# Altium integrated library vh_altium_library.intLib: 963 symbols (part 5 of 5) (continued)
## BYPASS-MINI-CLOSED (continued)
SOLDERDOT BYPASS; Manufacturer Part Number 1: Board Feature; Reel: Closed; Description: Solderdot; Supplier 1: Solder-it-yourself; Manufacturer 1: Board feature
footprint BYPASS-MINI-CLOSED (SOLDERDOT BYPASS)
pins: 1, 2

## DF9-25
designator K?
HIROSE DF9 25 PIN
pins: 1, 2, 3, 4, 5, 6, 7, 8, 9, 10, 11, 12, 13, 14, 15, 16, 17, 18, 19, 20, 21, 22, 23, 24, 25

## DF9-31-F
designator K?
HIROSE DF9 31 PIN
footprint DF9-31-F
pins: 1, 2, 3, 4, 5, 6, 7, 8, 9, 10, 11, 12, 13, 14, 15, 16, 17, 18, 19, 20, 21, 22, 23, 24, 25, 26, 27, 28, 29, 30, 31

## MMC
designator K?
MMC CONNECTOR
pins: 1 CS, 2 DI, 3 VSS, 4 VDD, 5 SCLK, 6 VSS, 7 DO, 8 IRQ, 9 RSV, 10 CD, 11 COM, 12 SHIELD, 13 WP
text: SD / MMC

## MOLEX-501951-3010
designator K?
footprint molex-501951-3010 (MOLEX FPC CONNECTOR 30 POSITIONS)
pins: 1, 2, 3, 4, 5, 6, 7, 8, 9, 10, 11, 12, 13, 14, 15, 16, 17, 18, 19, 20, 21, 22, 23, 24, 25, 26, 27, 28, 29, 30


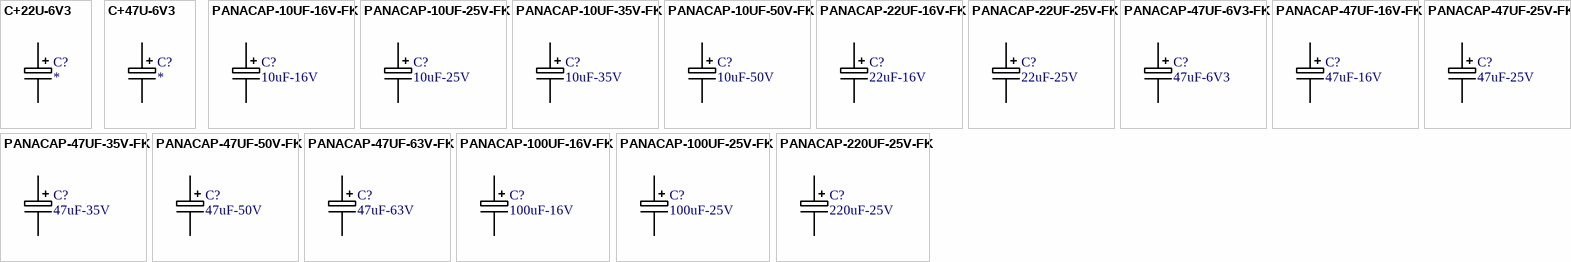
[diagram p57: symbols C+22U-6V3 to PANACAP-220UF-25V-FK]

## C+22U-6V3
designator C?
GENERIC CAPACITOR POLARISED; Supplier 1: Digi-Key; Supplier Part Number 1: PCE4373TR-ND
footprint PANACAP-B (Footprint not found)
pins: +, -

## C+47U-6V3
designator C?
GENERIC CAPACITOR POLARISED; Supplier 1: Digi-Key; Supplier Part Number 1: PCE4375TR-ND
footprint PANACAP-C
pins: +, -

## PANACAP-10UF-16V-FK
designator C?, comment 10uF-16V
GENERIC CAPACITOR POLARISED; Supplier 1: Digi-Key; Supplier Part Number 1: PCE3782TR-ND
footprint PANACAP-b
pins: +, -

## PANACAP-10UF-25V-FK
designator C?, comment 10uF-25V
GENERIC CAPACITOR POLARISED; Supplier 1: Digi-Key; Supplier Part Number 1: PCE4407TR-ND
footprint PANACAP-B
pins: +, -

## PANACAP-10UF-35V-FK
designator C?, comment 10uF-35V
GENERIC CAPACITOR POLARISED; Supplier 1: Digi-Key; Supplier Part Number 1: PCE3834TR-ND
footprint PANACAP-C
pins: +, -

## PANACAP-10UF-50V-FK
designator C?, comment 10uF-50V
GENERIC CAPACITOR POLARISED; Supplier 1: Digi-Key; Supplier Part Number 1: PCE3807TR-ND
footprint PANACAP-D-GENERIC
pins: +, -

## PANACAP-22UF-16V-FK
designator C?, comment 22uF-16V
GENERIC CAPACITOR POLARISED; Supplier 1: Digi-Key; Supplier Part Number 1: PCE3785TR-ND
footprint PANACAP-C
pins: +, -

## PANACAP-22UF-25V-FK
designator C?, comment 22uF-25V
GENERIC CAPACITOR POLARISED; Supplier 1: Digi-Key; Supplier Part Number 1: PCE3785DKR-ND
footprint PANACAP-C
pins: +, -

## PANACAP-47UF-6V3-FK
designator C?, comment 47uF-6V3
GENERIC CAPACITOR POLARISED; Supplier 1: Digi-Key; Supplier Part Number 1: PCE4374TR-ND
footprint PANACAP-C
pins: +, -

## PANACAP-47UF-16V-FK
designator C?, comment 47uF-16V
GENERIC CAPACITOR POLARISED; Supplier 1: Digi-Key; Supplier Part Number 1: PCE3398TR-ND
footprint PANACAP-D-GENERIC
pins: +, -

## PANACAP-47UF-25V-FK
designator C?, comment 47uF-25V
GENERIC CAPACITOR POLARISED; Supplier 1: Digi-Key; Supplier Part Number 1: PCE3804TR-ND
footprint PANACAP-D-GENERIC
pins: +, -

## PANACAP-47UF-35V-FK
designator C?, comment 47uF-35V
GENERIC CAPACITOR POLARISED; Supplier 1: Digi-Key; Supplier Part Number 1: PCE3842TR-ND
footprint PANACAP-D-GENERIC
pins: +, -

## PANACAP-47UF-50V-FK
designator C?, comment 47uF-50V
GENERIC CAPACITOR POLARISED; Supplier 1: Digi-Key; Supplier Part Number 1: PCE3816TR-ND
footprint PANACAP-E-GENERIC
pins: +, -

## PANACAP-47UF-63V-FK
designator C?, comment 47uF-63V
GENERIC CAPACITOR POLARISED; Supplier 1: Digi-Key; Supplier Part Number 1: PCE3823TR-ND
footprint PANACAP-F-GENERIC
pins: +, -

## PANACAP-100UF-16V-FK
designator C?, comment 100uF-16V
GENERIC CAPACITOR POLARISED; Supplier 1: Digi-Key; Supplier Part Number 1: PCE3783TR-ND
footprint PANACAP-D-GENERIC
pins: +, -

## PANACAP-100UF-25V-FK
designator C?, comment 100uF-25V
GENERIC CAPACITOR POLARISED; Supplier 1: Digi-Key; Supplier Part Number 1: PCE3408TR-ND
footprint PANACAP-e-GENERIC
pins: +, -

## PANACAP-220UF-25V-FK
designator C?, comment 220uF-25V
GENERIC CAPACITOR POLARISED; Supplier 1: Digi-Key; Supplier Part Number 1: PCE3400TR-ND
footprint PANACAP-F-GENERIC
pins: +, -


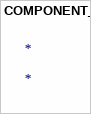
[diagram p58: symbol COMPONENT_1]

## COMPONENT_1
designator *


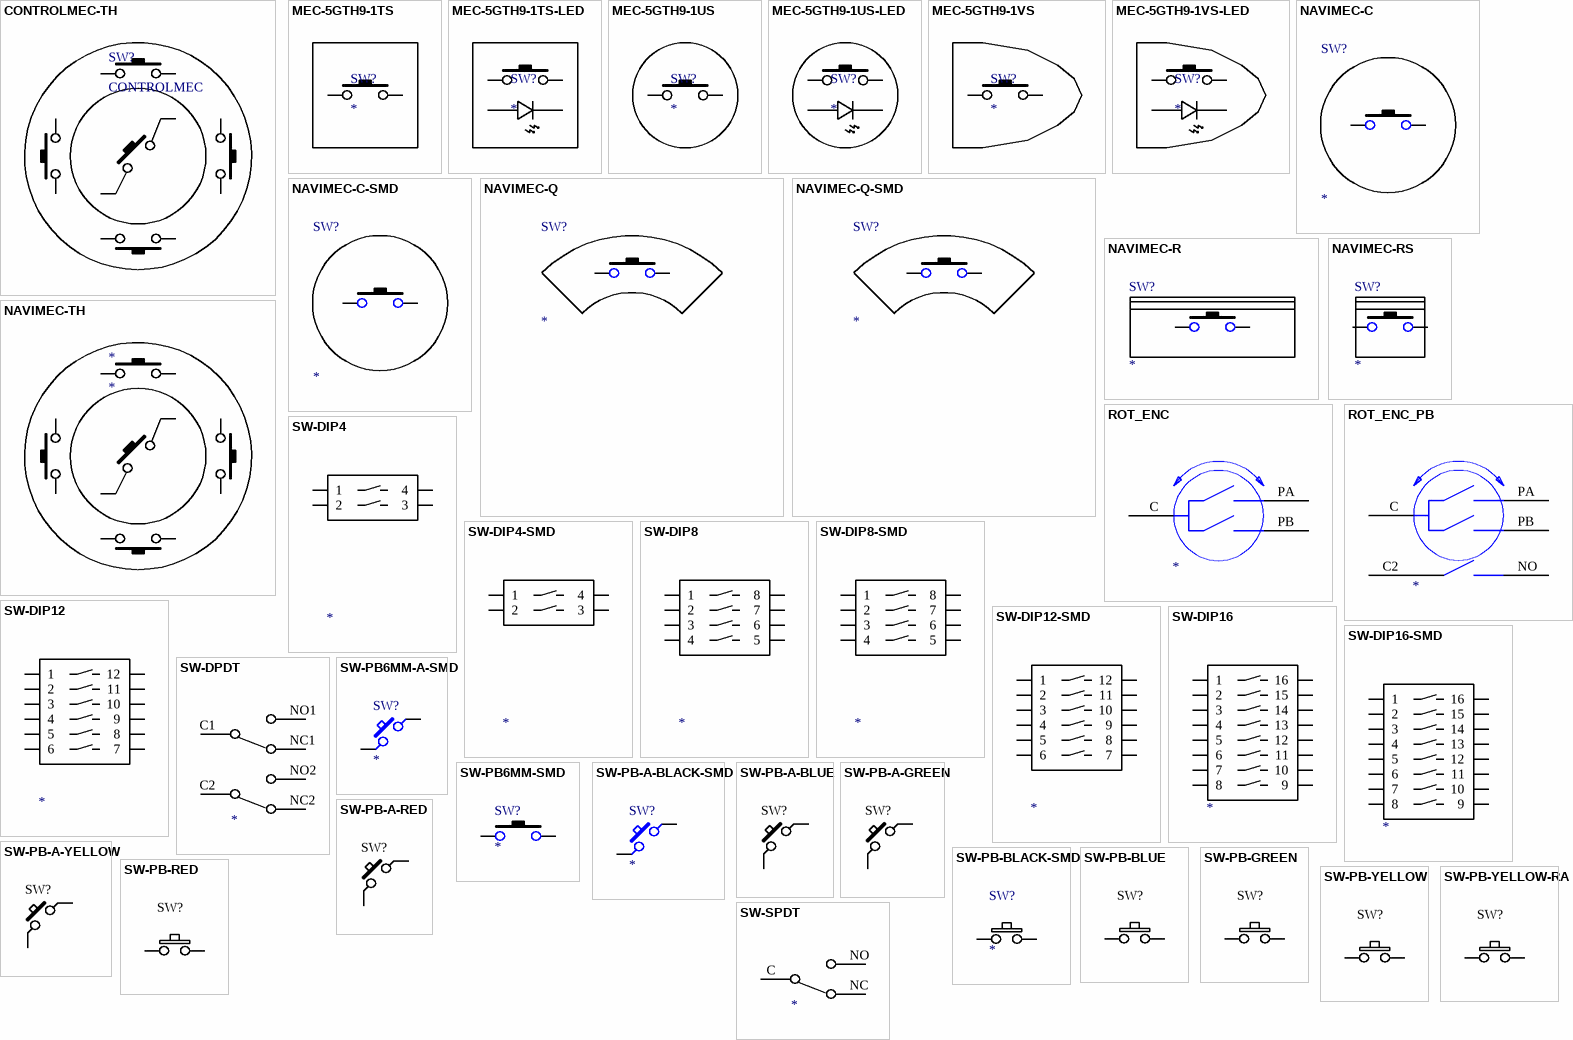
[diagram p59: symbols CONTROLMEC-TH to SW-SPDT]

## CONTROLMEC-TH
designator SW?, comment CONTROLMEC
footprint CONTROLMEC-FULL-TH
pins: B1, B2, L1, L2, M1, M2, R1, R2, T1, T2

## MEC-5GTH9-1TS
designator SW?
footprint MEC-5GTH9-1TS (MEC MULTIMEC 5G THROUGH HOLE + SQUARE CAP)
pins: 1, 2

## MEC-5GTH9-1TS-LED
designator SW?
footprint MEC-5GTH9-1TS (MEC MULTIMEC 5G THROUGH HOLE + SQUARE CAP)
pins: 1, 2, A, K

## MEC-5GTH9-1US
designator SW?
footprint MEC-5GTH9-1US (MEC MULTIMEC 5G THROUGH HOLE + ROUND CAP)
pins: 1, 2

## MEC-5GTH9-1US-LED
designator SW?
footprint MEC-5GTH9-1US (MEC MULTIMEC 5G THROUGH HOLE + ROUND CAP)
pins: 1, 2, A, K

## MEC-5GTH9-1VS
designator SW?
footprint MEC-5GTH9-1VS (MEC MULTIMEC 5G THROUGH HOLE + ARROW CAP)
pins: 1, 2

## MEC-5GTH9-1VS-LED
designator SW?
footprint MEC-5GTH9-1VS (MEC MULTIMEC 5G THROUGH HOLE + ARROW CAP)
pins: 1, 2, A, K

## NAVIMEC-C
designator SW?
NAVIMEC TH CENTER
footprint NAVIMEC-CENTER-TH
pins: 1, 2

## NAVIMEC-C-SMD
designator SW?
NAVIMEC SMD CENTER
footprint NAVIMEC-CENTER
pins: 1, 2

## NAVIMEC-Q
designator SW?
NAVIMEC TH QUADRANT
footprint NAVIMEC-QUADRANT-TH
pins: 1, 2

## NAVIMEC-Q-SMD
designator SW?
NAVIMEC SMD QUADRANT
footprint NAVIMEC-QUADRANT
pins: 1, 2

## NAVIMEC-R
designator SW?
NAVIMEC LONG RECTANGLE
footprint NAVIMEC-250
pins: 1, 2

## NAVIMEC-RS
designator SW?
NAVIMEC SMD SHORT RECTANGLE
pins: 1, 2

## NAVIMEC-TH
designator *
footprint NAVIMEC-FULL-TH
pins: B1, B2, L1, L2, M1, M2, R1, R2, T1, T2

## ROT_ENC
designator ?
ROTARY ENCODER
pins: C, PA, PB

## ROT_ENC_PB
designator ?
ROTARY ENCODER WITH PUSHBUTTON
pins: C, C2, NO, PA, PB

## SW-DIP4
designator ?
2 POLE DIP SWITCH
footprint SW-DIP4
pins: 1, 2, 3, 4

## SW-DIP4-SMD
designator ?
2 POLE DIP SWITCH SMD
footprint SO4SW
pins: 1, 2, 3, 4

## SW-DIP8
designator ?
4 POLE DIP SWITCH
footprint SW-DIP8
pins: 1, 2, 3, 4, 5, 6, 7, 8

## SW-DIP8-SMD
designator ?
4 POLE DIP SWITCH SMD
footprint SO8SW
pins: 1, 2, 3, 4, 5, 6, 7, 8

## SW-DIP12
designator ?
6 POLE DIP SWITCH
footprint SW-DIP12
pins: 1, 2, 3, 4, 5, 6, 7, 8, 9, 10, 11, 12

## SW-DIP12-SMD
designator ?
6 POLE DIP SWITCH SMD
footprint SO12SW
pins: 1, 2, 3, 4, 5, 6, 7, 8, 9, 10, 11, 12

## SW-DIP16
designator ?
8 POLE DIP SWITCH
footprint SW-DIP16
pins: 1, 2, 3, 4, 5, 6, 7, 8, 9, 10, 11, 12, 13, 14, 15, 16

## SW-DIP16-SMD
designator ?
8 POLE DIP SWITCH SMD
footprint SO16SW
pins: 1, 2, 3, 4, 5, 6, 7, 8, 9, 10, 11, 12, 13, 14, 15, 16

## SW-DPDT
designator ?
SWITCH DPDT PCB ANGLED
footprint MS-100968
pins: C1, C2, NC1, NC2, NO1, NO2

## SW-PB6MM-A-SMD
designator SW?
PUSHBUTTON SWITCH 6MM SMD
footprint SW-PB-SMD
pins: 1, 2

## SW-PB6MM-SMD
designator SW?
PUSHBUTTON SWITCH 6MM SMD
footprint SW-PB-SMD
pins: 1, 2

## SW-PB-A-BLACK-SMD
designator SW?
PUSHBUTTON SWITCH 6MM SMD
footprint SW-PB-SMD
pins: 1, 2

## SW-PB-A-BLUE
designator SW?
SW-D6-R / SW-DS-S / SW-14X14 / SW-7X7
footprint SW-PB-BLUE-ROUND4
pins: 1, 2

## SW-PB-A-GREEN
designator SW?
SW-D6-R / SW-DS-S / SW-14X14 / SW-7X7
footprint SW-PB-GREEN-ROUND4
pins: 1, 2

## SW-PB-A-RED
designator SW?
SW-D6-R / SW-DS-S / SW-14X14 / SW-7X7
footprint SW-PB-RED-ROUND4
pins: 1, 2

## SW-PB-A-YELLOW
designator SW?
SW-D6-R / SW-DS-S / SW-14X14 / SW-7X7
footprint SW-PB-YELLOW-ROUND4
pins: 1, 2

## SW-PB-BLACK-SMD
designator SW?
PUSHBUTTON SWITCH 6MM SMD
footprint SW-PB-SMD
pins: 1, 2

## SW-PB-BLUE
designator SW?
SW-D6-R / SW-DS-S / SW-14X14 / SW-7X7
footprint SW-PB-BLUE-ROUND4
pins: 1, 2

## SW-PB-GREEN
designator SW?
SW-D6-R / SW-DS-S / SW-14X14 / SW-7X7
footprint SW-PB-GREEN-ROUND4
pins: 1, 2

## SW-PB-RED
designator SW?
SW-D6-R / SW-DS-S / SW-14X14 / SW-7X7
footprint SW-PB-RED-ROUND4
pins: 1, 2

## SW-PB-YELLOW
designator SW?
SW-D6-R / SW-DS-S / SW-14X14 / SW-7X7
footprint SW-PB-YELLOW-ROUND4
pins: 1, 2

## SW-PB-YELLOW-RA
designator SW?
SW-D6-R / SW-DS-S / SW-14X14 / SW-7X7
footprint SW-OMRONRA-Y
pins: 1, 2

## SW-SPDT
designator ?
pins: C, NC, NO


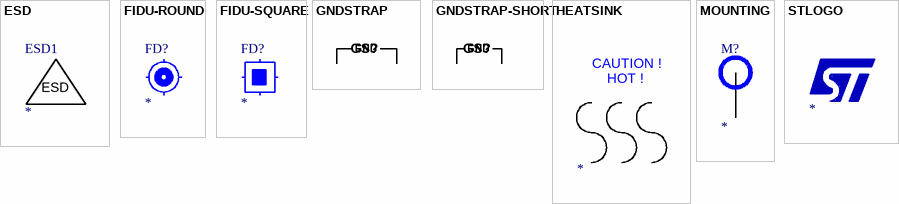
[diagram p60: symbols ESD to STLOGO]

## ESD
designator ESD1
ESD LOGO
footprint ESDSILK

## FIDU-ROUND
designator FD?
ROUND FIDUCIAL
footprint FIDU-ROUND

## FIDU-SQUARE
designator FD?
SQUARE FIDUCIAL
footprint FIDU-SQUARE

## GNDSTRAP
designator GS?, comment GND  (value not drawn)
GROUND CONNECTION BRIDGE; Manufacturer 1: Sharon Long Precision Industries; Manufacturer Part Number 1: Bend-It-Yourself; Reel: TH; Supplier 1: Sharon Long Industries; Supplier Part Number 1: Sharon Long Industries
footprint GNDSTRAP
pins: 1 GND, 2 GND

## GNDSTRAP-SHORT
designator GS?, comment GND  (value not drawn)
GROUND CONNECTION BRIDGE; Manufacturer: Sharon Long Precision Industries; Manufacturer Part Number: Bend-It-Yourself
footprint GNDSTRAP-S
pins: 1 GND, 2 GND

## HEATSINK
designator ?
text: CAUTION !; HOT !

## MOUNTING
designator M?
MOUNTING HOLE - NON INSTALLABLE
footprint MOUNTING
pins: 1, 2, 3, 4, 5, 6, 7

## STLOGO
designator ?
footprint STLOGO-SILVER
footprint STLOGO-MINI-SILVER


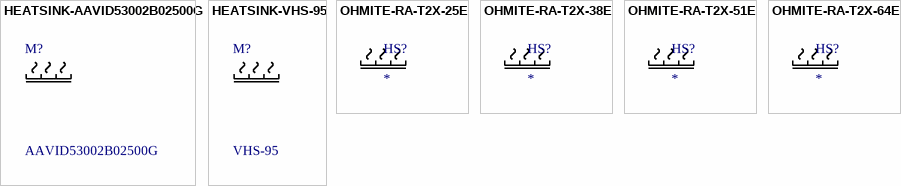
[diagram p61: symbols HEATSINK-AAVID53002B02500G to OHMITE-RA-T2X-64E]

## HEATSINK-AAVID53002B02500G
designator M?, comment AAVID53002B02500G
HEATSINK-AAVID53002B02500G
footprint AAVID53002B02500G

## HEATSINK-VHS-95
designator M?, comment VHS-95
footprint VHS-95 (HALF BRICK CONVERTER HEATSINK)

## OHMITE-RA-T2X-25E
designator HS?
HEATSINK; Supplier 1: Digi-Key; Supplier Part Number 1: RA-T2X-25E-ND
footprint OHMITE-RA-T2X-25E

## OHMITE-RA-T2X-38E
designator HS?
HEATSINK; Supplier 1: Digi-Key; Supplier Part Number 1: RA-T2X-38E-ND
footprint OHMITE-RA-T2X-38E

## OHMITE-RA-T2X-51E
designator HS?
HEATSINK; Supplier 1: Digi-Key; Supplier Part Number 1: RA-T2X-51E-ND
footprint OHMITE-RA-T2X-51E

## OHMITE-RA-T2X-64E
designator HS?
HEATSINK; Supplier 1: Digi-Key; Supplier Part Number 1: RA-T2X-64E-ND
footprint OHMITE-RA-T2X-64E


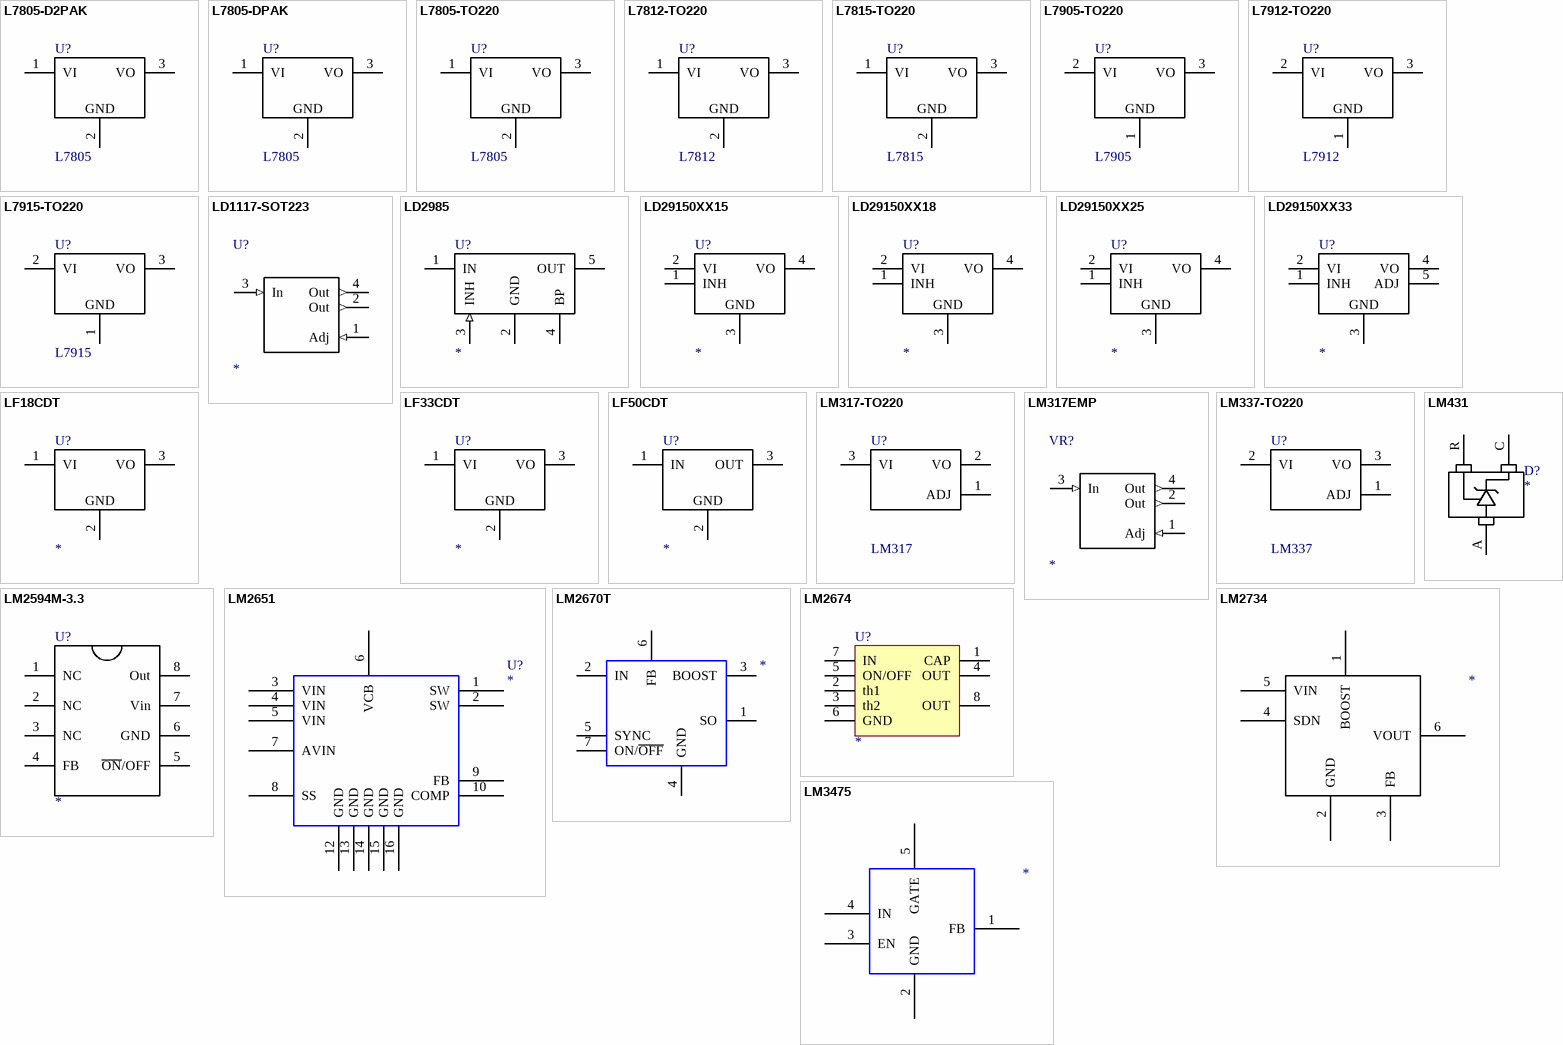
[diagram p62: symbols L7805-D2PAK to LM3475]

## L7805-D2PAK
designator U?, comment L7805
LINEAR REGULATOR 5.0V; Supplier 1: Digi-Key; Supplier Part Number 1: 497-1170-6-ND
footprint D2PAK
pins: 1 VI, 2, 3 VO
text: GND

## L7805-DPAK
designator U?, comment L7805
LINEAR REGULATOR 5.0V; Supplier 1: Digi-Key; Supplier Part Number 1: 497-7255-6-ND
footprint DPAK
pins: 1 VI, 2, 3 VO
text: GND

## L7805-TO220
designator U?, comment L7805
LINEAR REGULATOR 5.0V; Supplier 1: Mouser; Supplier Part Number 1: 511-L7805ACP
footprint to220-123-v (TO220 123 pin numbering Vertical mount)
pins: 1 VI, 2, 3 VO
text: GND

## L7812-TO220
designator U?, comment L7812
LINEAR REGULATOR 12.0V; Supplier 1: Mouser; Supplier 2: Mouser; Supplier Part Number 2: 511-L7812ABV
footprint to220-123-v (TO220 123 pin numbering Vertical mount)
pins: 1 VI, 2, 3 VO
text: GND

## L7815-TO220
designator U?, comment L7815
Low Drop Voltage Regulator 5.0V; Supplier 1: Mouser; Supplier Part Number 1: 511-L7815ABV
footprint to220-123-v (TO220 123 pin numbering Vertical mount)
pins: 1 VI, 2, 3 VO
text: GND

## L7905-TO220
designator U?, comment L7905
LINEAR REGULATOR -5.0V; Supplier 1: Mouser; Supplier Part Number 1: 511-L7905ACV
footprint to220-123-v (TO220 123 pin numbering Vertical mount)
pins: 1, 2 VI, 3 VO
text: GND

## L7912-TO220
designator U?, comment L7912
LINEAR REGULATOR -12.0V; Supplier 1: Mouser; Supplier Part Number 1: 511-L7912ACV
footprint to220-123-v (TO220 123 pin numbering Vertical mount)
pins: 1, 2 VI, 3 VO
text: GND

## L7915-TO220
designator U?, comment L7915
LINEAR REGULATOR -15.0V; Supplier 1: Mouser; Supplier Part Number 1: 511-L7915ACV
footprint to220-123-v (TO220 123 pin numbering Vertical mount)
pins: 1, 2 VI, 3 VO
text: GND

## LD1117-SOT223
designator U?
footprint SOT223
pins: 1 Adj (in), 2 Out (out), 3 In (in), 4 Out (out)

## LD2985
designator U?
Low Noise Low Drop Voltage Regulator  with Inhibit; Text Field1: ST; Text Field2: LK112SM33TR; Text Field3: ST; Text Field4: LK112SM33TR
footprint SOT23-5
pins: 1 IN (power), 2 GND (power), 3 INH (in), 4 BP (power), 5 OUT (power)

## LD29150XX15
designator U?
Low Drop Voltage Regulator 5.0V; Text Field1: ST; Text Field2: LF33CDT; Text Field3: Mouser; Text Field4: 511-LF33CDT; Text Field5: DPAK; Text Field6: 0.57; NI?: *; O?: *; Section:: *
footprint PPAK
pins: 1 INH, 2 VI, 3, 4 VO
text: GND

## LD29150XX18
designator U?
Low Drop Voltage Regulator 5.0V; Text Field1: ST; Text Field2: LF33CDT; Text Field3: Mouser; Text Field4: 511-LF33CDT; Text Field5: DPAK; Text Field6: 0.57; NI?: *; O?: *; Section:: *
footprint PPAK
pins: 1 INH, 2 VI, 3, 4 VO
text: GND

## LD29150XX25
designator U?
Low Drop Voltage Regulator 5.0V; Text Field1: ST; Text Field2: LF33CDT; Text Field3: Mouser; Text Field4: 511-LF33CDT; Text Field5: DPAK; Text Field6: 0.57; NI?: *; O?: *; Section:: *
footprint PPAK
pins: 1 INH, 2 VI, 3, 4 VO
text: GND

## LD29150XX33
designator U?
Low Drop Voltage Regulator 5.0V; Text Field1: ST; Text Field2: LF33CDT; Text Field3: Mouser; Text Field4: 511-LF33CDT; Text Field5: DPAK; Text Field6: 0.57; NI?: *; O?: *; Section:: *
footprint PPAK
pins: 1 INH, 2 VI, 3, 4 VO, 5 ADJ
text: GND

## LF18CDT
designator U?
Low Drop Voltage Regulator 1.8V; Text Field1: ST; Text Field2: LF33CDT; Text Field3: Mouser; Text Field4: 511-LF33CDT; Text Field5: DPAK; Text Field6: 0.57; NI?: *; O?: *; Section:: *
footprint DPAK
pins: 1 VI, 2, 3 VO
text: GND

## LF33CDT
designator U?
Low Drop Voltage Regulator 3.3V; Text Field1: ST; Text Field2: LF33CDT; Text Field3: Mouser; Text Field4: 511-LF33CDT; Text Field5: DPAK; Text Field6: 0.57; NI?: *; O?: *; Section:: *
footprint DPAK
pins: 1 VI, 2, 3 VO
text: GND

## LF50CDT
designator U?
Low Drop Voltage Regulator 5.0V; Text Field1: ST; Text Field2: LF33CDT; Text Field3: Mouser; Text Field4: 511-LF33CDT; Text Field5: DPAK; Text Field6: 0.57; NI?: *; O?: *; Section:: *
footprint DPAK
pins: 1 IN, 2, 3 OUT
text: GND

## LM317-TO220
designator U?, comment LM317
LINEAR REGULATOR ADJ POSITIVE; Supplier 1: Mouser; Supplier Part Number 1: 511-LM317MT
footprint to220-123-v (TO220 123 pin numbering Vertical mount)
pins: 1 ADJ, 2 VO, 3 VI

## LM317EMP
designator VR?
footprint SOT223
pins: 1 Adj (in), 2 Out (out), 3 In (in), 4 Out (out)

## LM337-TO220
designator U?, comment LM337
Low Drop Voltage Regulator 5.0V; Supplier 1: Digi-Key; Supplier Part Number 1: 497-1585-5-ND
footprint to220-123-v (TO220 123 pin numbering Vertical mount)
pins: 1 ADJ, 2 VI, 3 VO

## LM431
designator D?
pins: A, C, R

## LM2594M-3.3
designator U?
footprint SO8
pins: 1 NC, 2 NC, 3 NC, 4 FB, 5 ~{ON}/OFF, 6 GND, 7 Vin, 8 Out

## LM2651
designator U?
SYNCHRONOUS STEP DOWN REGULATOR
footprint TSSOP16
pins: 1 SW, 2 SW, 3 VIN, 4 VIN, 5 VIN, 6 VCB, 7 AVIN, 8 SS, 9 FB, 10 COMP, 12 GND, 13 GND, 14 GND, 15 GND, 16 GND

## LM2670T
designator ?
pins: 1 SO, 2 IN, 3 BOOST, 4 GND, 5 SYNC, 6 FB, 7 ON/~{OFF}

## LM2674
designator U?
footprint DIP8
pins: 1 CAP, 2 th1, 3 th2, 4 OUT, 5 ON/OFF, 6 GND, 7 IN, 8 OUT

## LM2734
designator ?
pins: 1 BOOST, 2 GND, 3 FB, 4 SDN, 5 VIN, 6 VOUT

## LM3475
designator ?
pins: 1 FB, 2 GND, 3 EN, 4 IN, 5 GATE

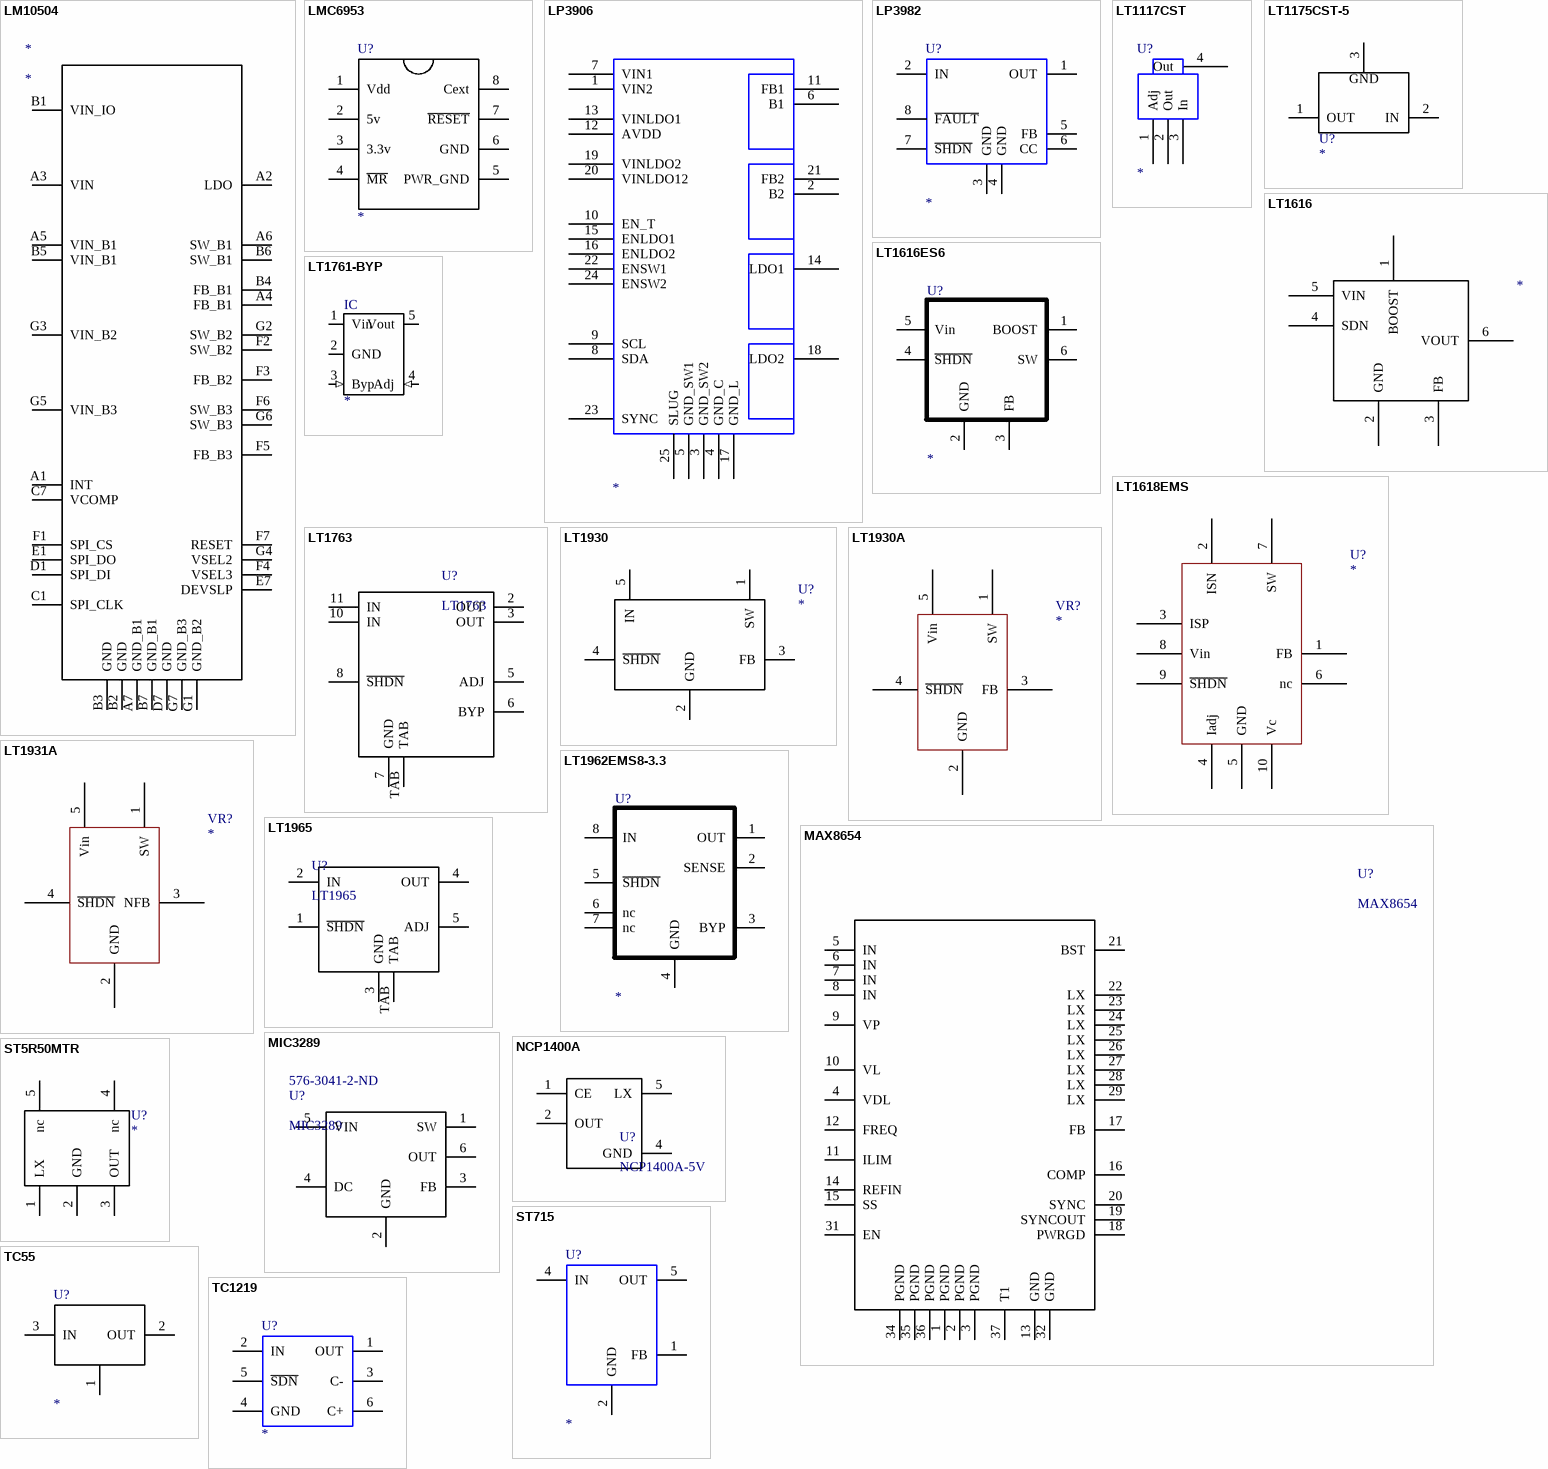
[diagram p63: symbols LM10504 to TC1219]

## LM10504
designator *
Supplier 1: Digi-Key; Supplier Part Number 1: LM10504TME/NOPBTR-ND
footprint LM10504
pins: A1 INT, A2 LDO, A3 VIN, A4 FB_B1, A5 VIN_B1, A6 SW_B1, A7 GND_B1, B1 VIN_IO, B2 GND, B3 GND, B4 FB_B1, B5 VIN_B1, B6 SW_B1, B7 GND_B1, C1 SPI_CLK, C7 VCOMP, D1 SPI_DI, D7 GND, E1 SPI_DO, E7 DEVSLP, F1 SPI_CS, F2 SW_B2, F3 FB_B2, F4 VSEL3, F5 FB_B3, F6 SW_B3, F7 RESET, G1 GND_B2, G2 SW_B2, G3 VIN_B2, G4 VSEL2, G5 VIN_B3, G6 SW_B3, G7 GND_B3

## LMC6953
designator U?
pins: 1 Vdd, 2 5v, 3 3.3v, 4 ~{MR}, 5 PWR_GND, 6 GND, 7 ~{RESET}, 8 Cext

## LP3906
designator ?
pins: 1 VIN2, 2 B2, 3 GND_SW2, 4 GND_C, 5 GND_SW1, 6 B1, 7 VIN1, 8 SDA, 9 SCL, 10 EN_T, 11 FB1, 12 AVDD, 13 VINLDO1, 14 LDO1, 15 ENLDO1, 16 ENLDO2, 17 GND_L, 18 LDO2, 19 VINLDO2, 20 VINLDO12, 21 FB2, 22 ENSW1, 23 SYNC, 24 ENSW2, 25 SLUG

## LP3982
designator U?
LOW POWER LDO MSOP8
footprint MSOP8
pins: 1 OUT, 2 IN, 3 GND, 4 GND, 5 FB, 6 CC, 7 ~{SHDN}, 8 ~{FAULT}

## LT1117CST
designator U?
pins: 1 Adj, 2 Out, 3 In, 4 Out

## LT1175CST-5
designator U?
Low Drop Voltage Regulator 5.0V; Text Field1: ST; Text Field2: LF33CDT; Text Field3: Mouser; Text Field4: 511-LF33CDT; Text Field5: DPAK; Text Field6: 0.57; NI?: *; O?: *; Section:: *
footprint DPAK
pins: 1 OUT, 2 IN, 3
text: GND

## LT1616
designator ?
pins: 1 BOOST, 2 GND, 3 FB, 4 SDN, 5 VIN, 6 VOUT

## LT1616ES6
designator U?
footprint SOT23-6
pins: 1 BOOST, 2 GND, 3 FB, 4 ~{SHDN}, 5 Vin, 6 SW

## LT1618EMS
designator U?
footprint MSOP10
pins: 1 FB, 2 ISN, 3 ISP, 4 Iadj, 5 GND, 6 nc, 7 SW, 8 Vin, 9 ~{SHDN}, 10 Vc

## LT1761-BYP
designator IC
Adjustable, 100mA, low-noise, LDO regulator
footprint SOT23-5
pins: 1 Vin (power), 2 GND (power), 3 Byp (in), 4 Adj (in), 5 Vout (power)

## LT1763
designator U?
pins: 2 OUT, 3 OUT, 5 ADJ, 6 BYP, 7 GND, 8 ~{SHDN}, 10 IN, 11 IN, TAB

## LT1930
designator U?
LT1930 STEP UP SWITCHING CONVERTOR
footprint SOT23-5
pins: 1 SW, 2 GND, 3 FB, 4 ~{SHDN}, 5 IN

## LT1930A
designator VR?
footprint SOT23-5
pins: 1 SW, 2 GND, 3 FB, 4 ~{SHDN}, 5 Vin

## LT1931A
designator VR?
footprint SOT23-5
pins: 1 SW, 2 GND, 3 NFB, 4 ~{SHDN}, 5 Vin

## LT1962EMS8-3.3
designator U?
footprint MSOP8
pins: 1 OUT, 2 SENSE, 3 BYP, 4 GND, 5 ~{SHDN}, 6 nc, 7 nc, 8 IN

## LT1965
designator U?
footprint TO263-5
pins: 1 ~{SHDN}, 2 IN, 3 GND, 4 OUT, 5 ADJ, TAB

## MAX8654
designator U?
Supplier 1: Digi-Key; Supplier Part Number 1: MAX8654ETX+T-ND
footprint QFN36EP (Footprint not found)
pins: 1 PGND, 2 PGND, 3 PGND, 4 VDL, 5 IN, 6 IN, 7 IN, 8 IN, 9 VP, 10 VL, 11 ILIM, 12 FREQ, 13 GND, 14 REFIN, 15 SS, 16 COMP, 17 FB, 18 PWRGD, 19 SYNCOUT, 20 SYNC, 21 BST, 22 LX, 23 LX, 24 LX, 25 LX, 26 LX, 27 LX, 28 LX, 29 LX, 31 EN, 32 GND, 34 PGND, 35 PGND, 36 PGND, 37 T1

## MIC3289
designator U?  Supplier Part Number 1: 576-3041-2-ND
Supplier 1: Digi-Key
footprint SOT23-6
pins: 1 SW, 2 GND, 3 FB, 4 DC, 5 VIN, 6 OUT

## NCP1400A
designator U?, comment NCP1400A-5V
Supplier 1: Digi-Key; Supplier Part Number 1: NCP1400ASN50TOSTR-ND
footprint SOT23-5
pins: 1 CE, 2 OUT, 4 GND, 5 LX

## ST5R50MTR
designator U?
footprint SOT23-5
pins: 1 LX, 2 GND, 3 OUT, 4 nc, 5 nc

## ST715
designator U?
MICROPOWER VOLTAGE REGULATOR; Manufacturer Part Number: ST715MR; Manufacturer: STMicroelectronics; Description: IC REG LDO 85MA ADJ SOT23-5; Reel: U1; Supplier 1: Digi-Key; Supplier Part Number 1: 497-6832-2-ND
footprint SOT23-5
pins: 1 FB, 2 GND, 4 IN, 5 OUT

## TC55
designator U?
TC55 VOLTAGE  REGULATOR
footprint SOT23-123
pins: 1 GND, 2 OUT, 3 IN

## TC1219
designator U?
SWITCH CAP VOLTAGE INVERTER; Manufacturer Part Number: TC1219ECHTR; Manufacturer: Microchip Technology; Description: IC CHARGE PUMP CONV SD SOT23A-6; Supplier 1: Digi-Key; Supplier Part Number 1: TC1219ECHTR-ND
footprint SOT23-6
pins: 1 OUT, 2 IN, 3 C-, 4 GND, 5 ~{SDN}, 6 C+


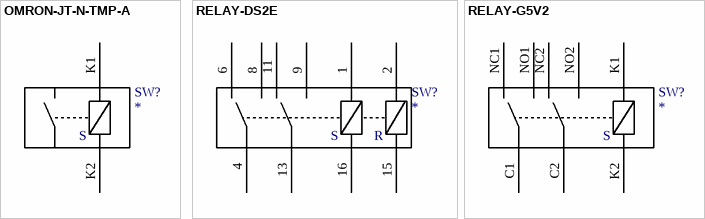
[diagram p64: symbols OMRON-JT-N-TMP-A to RELAY-G5V2]

## OMRON-JT-N-TMP-A
designator SW?
RELAY DPDT SINGLE COIL; Text Field1: NAIS-OMRON; Text Field2: DS2E-ML2-DV12V; Text Field3: DIGIKEY; Supplier 1: Mouser; Supplier Part Number 1: 769-JTN1ASTMPFDC12V
footprint OMRON-JT-N-TMP-A (OMRON POWER RELAY FASTON SPST)
pins: K1, K2
text: S

## RELAY-DS2E
designator SW?
RELAY TELECOM DPDT DUAL COIL SHIELDED; Text Field1: NAIS-OMRON; Text Field2: DS2E-ML2-DV12V; Text Field3: DIGIKEY
footprint RELAY-DS2E
pins: 1, 2, 4, 6, 8, 9, 11, 13, 15, 16
text: S; R

## RELAY-G5V2
designator SW?
RELAY DPDT SINGLE COIL; Text Field1: NAIS-OMRON; Text Field2: DS2E-ML2-DV12V; Text Field3: DIGIKEY
footprint RELAY-G5V-2
pins: C1, C2, K1, K2, NC1, NC2, NO1, NO2
text: S


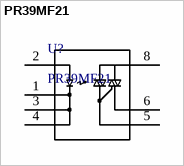
[diagram p65: symbol PR39MF21]

## PR39MF21
designator U?
Supplier 1: Digi-Key; Supplier Part Number 1: 425-2374-5-ND
footprint dip8-ssr
pins: 1 K, 2 A, 3 K, 4 K, 5, 6, 8


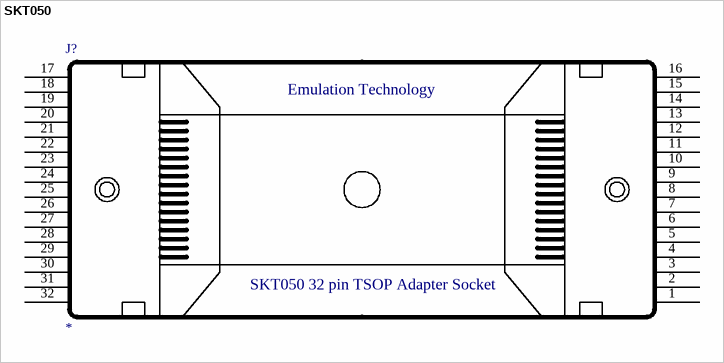
[diagram p66: symbol SKT050]

## SKT050
designator J?
pins: 1, 2, 3, 4, 5, 6, 7, 8, 9, 10, 11, 12, 13, 14, 15, 16, 17, 18, 19, 20, 21, 22, 23, 24, 25, 26, 27, 28, 29, 30, 31, 32
text: Emulation Technology; SKT050 32 pin TSOP Adapter Socket


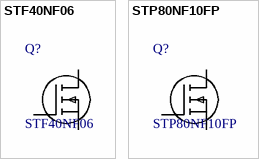
[diagram p67: symbols STF40NF06 to STP80NF10FP]

## STF40NF06
designator Q?
N CHANNEL MOSFET; Supplier 1: Digi-Key; Supplier Part Number 1: 497-4343-5-ND
footprint TO220V-GDS
pins: D, G, S

## STP80NF10FP
designator Q?
N CHANNEL MOSFET; Supplier 1: Digi-Key; Supplier Part Number 1: 497-5897-5-ND
footprint TO220V-GDS
pins: D, G, S


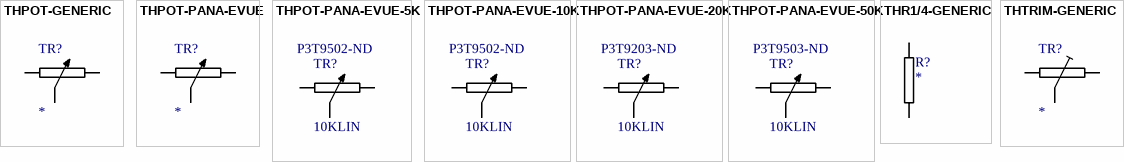
[diagram p68: symbols THPOT-GENERIC to THTRIM-GENERIC]

## THPOT-GENERIC
designator TR?
Adjustable resistor
pins: 1, 2, W

## THPOT-PANA-EVUE
designator TR?
Adjustable resistor
footprint pot-pana-evue
pins: 1, 2, W

## THPOT-PANA-EVUE-5K
designator TR?, comment 10KLIN  Supplier Part Number 1: P3T9502-ND
Adjustable resistor; Supplier 1: Digi-Key
footprint pot-pana-evue
pins: 1, 2, W

## THPOT-PANA-EVUE-10K
designator TR?, comment 10KLIN  Supplier Part Number 1: P3T9502-ND
Adjustable resistor; Supplier 1: Digi-Key
footprint pot-pana-evue
pins: 1, 2, W

## THPOT-PANA-EVUE-20K
designator TR?, comment 10KLIN  Supplier Part Number 1: P3T9203-ND
Adjustable resistor; Supplier 1: Digi-Key
footprint pot-pana-evue
pins: 1, 2, W

## THPOT-PANA-EVUE-50K
designator TR?, comment 10KLIN  Supplier Part Number 1: P3T9503-ND
Adjustable resistor; Supplier 1: Digi-Key
footprint pot-pana-evue
pins: 1, 2, W

## THR1/4-GENERIC
designator R?
GENERIC THROUGH HOLE 1/4 WATT RESISTOR
footprint THR1/4-GENERIC
pins: 1, 2

## THTRIM-GENERIC
designator TR?
TRIMMABLE RESISTOR
footprint TRIMMER-MT
pins: 1, 2, W